# Altium footprint library pyAI-K210.PcbLib: 1 footprints
Each footprint in its own frame and in the unit in brackets; x right, y up, seen from the top. Pads: shape width x height; smd on the part's side, far side on the other; paste and mask are expansions set on the pad; w line width, h text height; cw(c..) or ccw(c..) is an arc to the next point about the centre after c.
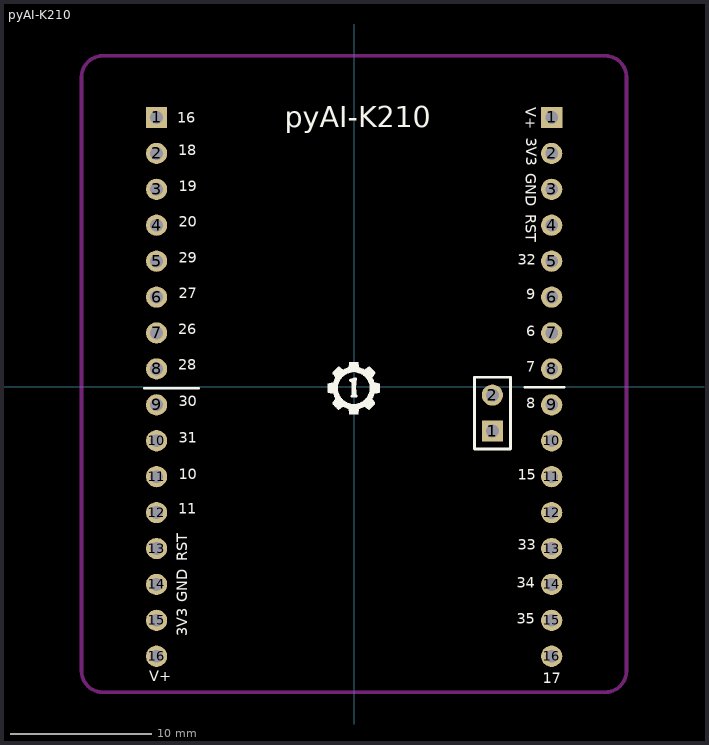
[diagram p0: the footprint, top view; thin cyan lines are the x and y axes]

## pyAI-K210 [mm]
pads (34):
  rect 1.5x1.5 hole 0.9: 1(-13.97,19.05) 1(9.779,-3.124) 1(13.97,19.05)
  round 1.5 hole 0.9: 2(-13.97,16.51) 2(9.779,-0.584) 2(13.97,16.51) 3(-13.97,13.97) 3(13.97,13.97) 4(-13.97,11.43) 4(13.97,11.43) 5(-13.97,8.89) 5(13.97,8.89) 6(-13.97,6.35) 6(13.97,6.35) 7(-13.97,3.81) 7(13.97,3.81) 8(-13.97,1.27) 8(13.97,1.27) 9(-13.97,-1.27) 9(13.97,-1.27) 10(-13.97,-3.81) 10(13.97,-3.81) 11(-13.97,-6.35) 11(13.97,-6.35) 12(-13.97,-8.89) 12(13.97,-8.89) 13(-13.97,-11.43) 13(13.97,-11.43) 14(-13.97,-13.97) 14(13.97,-13.97) 15(-13.97,-16.51) 15(13.97,-16.51) 16(-13.97,-19.05) 16(13.97,-19.05)
Top Overlay:
  drawing of 331 lines, arcs and shapes, not listed
  text "V+" at -14.476,-21.073 h1.27
  text "pyAI-K210" at -4.902,17.856 h2.54
  text "17" at 13.337,-21.2 h1.27
  text "35" at 11.517,-17.009 h1.27
  text "34" at 11.508,-14.444 h1.27
  text "33" at 11.556,-11.752 h1.27
  text "15" at 11.565,-6.824 h1.27
  text "8" at 12.168,-1.744 h1.27
  text "7" at 12.171,0.821 h1.27
  text "6" at 12.186,3.336 h1.27
  text "9" at 12.186,5.952 h1.27
  text "32" at 11.564,8.391 h1.27
  text "RST" at 11.876,12.216 h1.27
  text "GND" at 11.876,15.111 h1.27
  text "3V3" at 11.913,17.601 h1.27
  text "V+" at 11.89,19.76 h1.27
  text "3V3" at -11.551,-17.651 h1.27
  text "GND" at -11.54,-15.238 h1.27
  text "RST" at -11.566,-12.317 h1.27
  text "11" at -12.419,-9.237 h1.27
  text "10" at -12.394,-6.773 h1.27
  text "31" at -12.394,-4.182 h1.27
  text "30" at -12.394,-1.617 h1.27
  text "28" at -12.419,0.948 h1.27
  text "26" at -12.419,3.488 h1.27
  text "27" at -12.413,6.007 h1.27
  text "29" at -12.394,8.529 h1.27
  text "20" at -12.418,11.087 h1.27
  text "19" at -12.394,13.583 h1.27
  text "18" at -12.444,16.138 h1.27
  text "16" at -12.521,18.432 h1.27
Keep-Out Layer:
  lines w0.254: -19.279,21.907 cw(c-17.779,21.907) -17.779,23.407 ; -19.279,21.91 -19.279,-20.09 ccw(c-17.779,-20.09) -17.779,-21.59 17.761,-21.59 ; -17.779,23.41 17.761,23.41 ; 17.759,-21.59 ccw(c17.759,-20.09) 19.259,-20.09 ; 17.759,23.407 cw(c17.759,21.907) 19.259,21.907 ; 19.261,-20.09 19.261,21.91